# Altium footprint library TarabusLib_KOR.PcbLib: 560 footprints (part 14 of 35)
Each footprint in its own frame and in the unit in brackets; x right, y up, seen from the top. Pads: shape width x height; smd on the part's side, far side on the other; paste and mask are expansions set on the pad; w line width, h text height; cw(c..) or ccw(c..) is an arc to the next point about the centre after c.
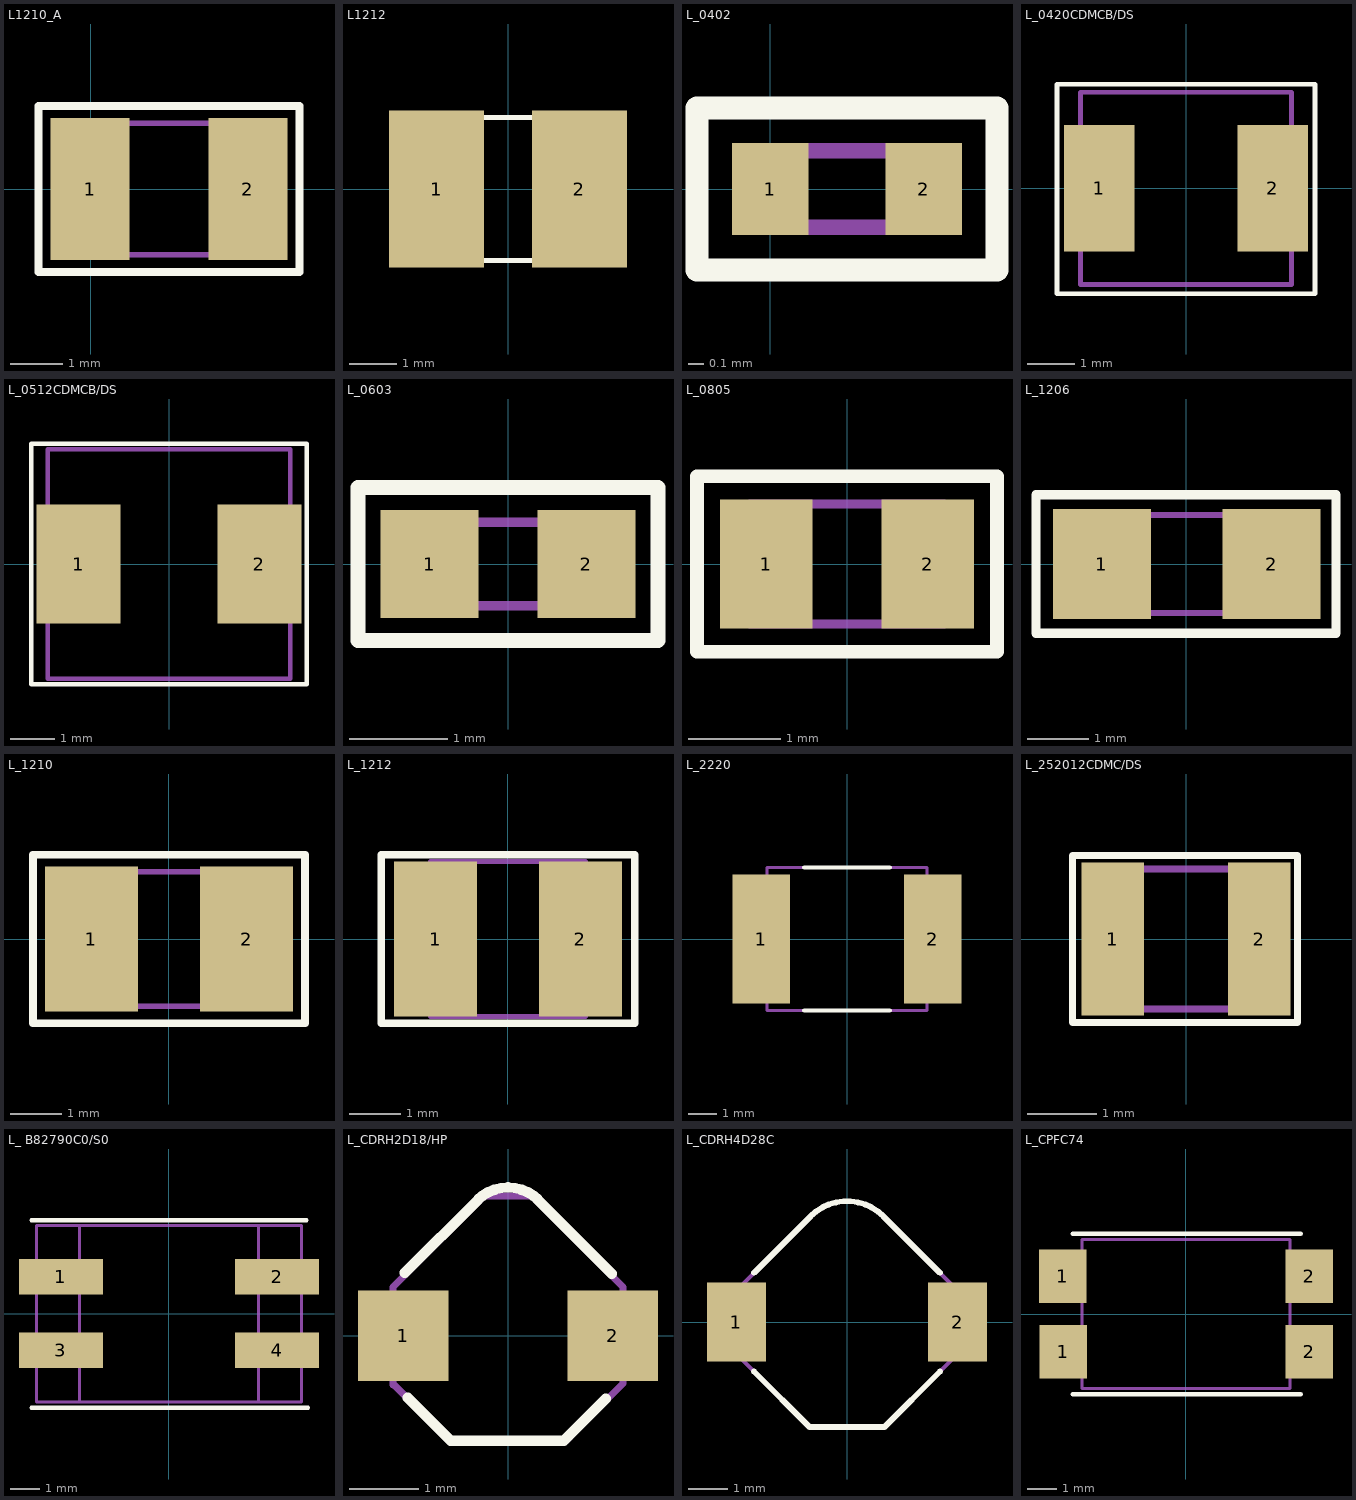
[diagram p13: the footprints below, top view; thin cyan lines are the x and y axes]

## L1210_A [mm]
pads (2):
  rect 1.5x2.7 smd: 1(-0.01,0) 2(2.99,0)
Top Overlay:
  lines w0.15: -0.99,-1.58 -0.99,1.58 3.97,1.58 3.97,-1.58 -0.99,-1.58
Mechanical 7:
  lines w0.1: -0.11,-1.25 3.09,-1.25 3.09,1.25 -0.11,1.25 -0.11,-1.25
Mechanical 10:
  text ".Designator" at 0.78,1.89 h0.8
  text ".Comment" at 0.75,-2.23 h0.6
3D body: height 2.5, standoff 0, extent -0.11,-1.25 3.09,1.25

## L1212 [mm]
pads (2):
  rect 2x3.3 smd: 1(-1.5,0) 2(1.5,0)
Top Overlay:
  lines w0.1: -1.5,-1.5 -1.5,1.5 1.5,1.5 1.5,-1.5 -1.5,-1.5
Mechanical 7:
  lines w0.1: -1.5,-1.5 -1.5,1.5 1.5,1.5 1.5,-1.5 -1.5,-1.5
Mechanical 10:
  text ".Comment" at -1,3.8 h1
  text ".Designator" at -1,2.9 h1

## L_0402 [mm]
pads (2):
  rect 0.5x0.6 smd: 1(0,0) 2(1,0)
Top Overlay:
  lines w0.15: -0.48,-0.53 1.48,-0.53 1.48,0.53 -0.48,0.53 -0.48,-0.53
Mechanical 7:
  lines w0.1: 0,-0.25 0,0.25 1,0.25 1,-0.25 0,-0.25
Mechanical 10:
  text ".Comment" at -0.08,-1.11 h0.6
  text ".Designator" at -0.08,0.75 h0.8
3D body: height 0.35, standoff 0, extent 0,-0.25 1,0.25

## L_0420CDMCB/DS [mm] "SMD Power Inductor SUMIDA"
height 1.2
pads (2):
  rect 1.5x2.7 smd mask+0: 1(-1.85,0) 2(1.85,0)
Top Overlay:
  lines w0.1: -2.75,-2.25 -2.75,2.225 2.75,2.225 2.75,-2.25 -2.75,-2.25
Mechanical 9:
  text ".Comment" at -1.15,-2.8 h0.6
  text ".Designator" at -1.8,2.5 h0.8
Mechanical 11:
  lines w0.1: -2.25,-2.05 2.25,-2.05 2.25,2.05 -2.25,2.05 -2.25,-2.05
3D body: height 1.2, standoff 0.05, extent -2.25,-2.05 2.25,2.05

## L_0512CDMCB/DS [mm] "SMD Power Inductor SUMIDA"
height 1.2
pads (2):
  rect 1.9x2.7 smd mask+0: 1(-2.05,0) 2(2.05,0)
Top Overlay:
  lines w0.1: -3.125,-2.725 3.125,-2.725 3.125,2.725 -3.125,2.725 -3.125,-2.725
Mechanical 7:
  lines w0.1: -2.75,-2.6 -2.75,2.6 2.75,2.6 2.75,-2.6 -2.75,-2.6
Mechanical 10:
  text ".Designator" at -1.775,3 h0.8
  text ".Comment" at -1.1,-3.275 h0.6
3D body: height 1.2, standoff 0.05, extent -2.75,-2.6 2.75,2.6

## L_0603 [mm]
height 0.45
pads (2):
  rect 1x1.1 smd: 1(-0.8,0) 2(0.8,0)
Top Overlay:
  lines w0.15: -1.53,-0.78 -1.53,0.78 1.53,0.78 1.53,-0.78 -1.53,-0.78
Mechanical 7:
  lines w0.1: -0.8,-0.425 0.8,-0.425 0.8,0.425 -0.8,0.425 -0.8,-0.425
Mechanical 10:
  text ".Designator" at -0.62,1 h0.8
  text ".Comment" at -0.78,-1.36 h0.6
3D body: height 0.45, standoff 0, extent -0.8,-0.425 0.8,0.425

## L_0805 [mm]
height 1.4
pads (2):
  rect 1x1.4 smd: 1(-0.875,0) 2(0.875,0)
Top Overlay:
  lines w0.15: -1.625,-0.95 1.625,-0.95 1.625,0.95 -1.625,0.95 -1.625,-0.95
Mechanical 7:
  lines w0.1: -1.05,-0.65 1.05,-0.65 1.05,0.65 -1.05,0.65 -1.05,-0.65
Mechanical 10:
  text ".Comment" at -1.125,-1.625 h0.6
  text ".Designator" at -1.525,1.375 h0.8
3D body: height 1.4, standoff 0, extent -1.05,-0.65 1.05,0.65

## L_1206 [mm]
height 1.5
pads (2):
  rect 1.6x1.8 smd: 1(-1.375,0) 2(1.4,0)
Top Overlay:
  lines w0.15: -2.45,-1.13 2.45,-1.13 2.45,1.13 -2.45,1.13 -2.45,-1.13
Mechanical 7:
  lines w0.1: -1.6,-0.8 -1.6,0.8 1.6,0.8 1.6,-0.8 -1.6,-0.8
Mechanical 10:
  text ".Comment" at -1.075,-1.65 h0.6
  text ".Designator" at -1.375,1.35 h0.8
3D body: height 1.5, standoff 0, extent -1.6,-0.8 1.6,0.8

## L_1210 [mm]
height 0.55
pads (2):
  rect 1.8x2.8 smd: 1(-1.5,0) 2(1.5,0)
Top Overlay:
  lines w0.15: -2.63,-1.63 2.63,-1.63 2.63,1.63 -2.63,1.63 -2.63,-1.63
Mechanical 7:
  lines w0.1: -1.6,-1.3 1.6,-1.3 1.6,1.3 -1.6,1.3 -1.6,-1.3
Mechanical 10:
  text ".Designator" at -0.71,1.89 h0.8
  text ".Comment" at -0.81,-2.25 h0.6
3D body: height 0.55, standoff 0, extent -1.55,-1.3 1.55,1.3

## L_1212 [mm]
height 0.9
pads (2):
  rect 1.6x3 smd: 1(-1.4,0) 2(1.4,0)
Top Overlay:
  lines w0.15: -2.45,-1.63 -2.45,1.63 2.45,1.63 2.45,-1.63 -2.45,-1.63
Mechanical 7:
  lines w0.1: -1.5,-1.5 -1.5,1.5 1.5,1.5 1.5,-1.5 -1.5,-1.5
Mechanical 10:
  text ".Comment" at -0.81,-2.25 h0.6
  text ".Designator" at -0.71,1.89 h0.8
3D body: height 0.9, standoff 0, extent -1.5,-1.5 1.5,1.5

## L_2220 [mm]
height 1.8
pads (2):
  rect 2x4.5 smd: 1(-3,0) 2(3,0)
Top Overlay:
  lines w0.15: -1.5,-2.5 1.5,-2.5 ; -1.5,2.5 1.5,2.5
Mechanical 7:
  lines w0.1: -2.8,-2.5 -2.8,2.5 2.8,2.5 2.8,-2.5 -2.8,-2.5
Mechanical 10:
  text ".Designator" at -0.56,3.04 h0.8
  text ".Comment" at -0.5,-3.49 h0.6
3D body: height 5, standoff 0, extent -2.8,-2.5 2.8,2.5

## L_252012CDMC/DS [mm] "SMD Power Inductor SUMIDA"
height 1.2
pads (2):
  rect 0.9x2.2 smd mask+0: 1(-1.05,0) 2(1.05,0)
Top Overlay:
  lines w0.1: -1.625,-1.2 1.6,-1.2 1.6,1.2 -1.625,1.2 -1.625,-1.2
Mechanical 7:
  lines w0.1: -1.25,-1 1.25,-1 1.25,1 -1.25,1 -1.25,-1
Mechanical 10:
  text ".Designator" at -1.7,1.475 h0.8
  text ".Comment" at -1.725,-1.8 h0.6
3D body: height 1.2, standoff 0.05, extent -1.25,-1 1.25,1

## L_ B82790C0/S0 [mm]
height 5
pads (4):
  rect 2.85x1.2 smd: 1(-3.675,1.25) 2(3.675,1.25) 3(-3.675,-1.25) 4(3.675,-1.25)
Top Overlay:
  lines w0.15: -4.675,-3.2 4.725,-3.2 ; -4.675,3.175 4.675,3.175
Mechanical 7:
  lines w0.1: -3.05,-3 -3.05,3 ; 3.05,-3 3.05,3 ; -4.5,-3 -4.5,3 4.5,3 4.5,-3 -4.5,-3
Mechanical 10:
  text ".Designator" at -1.7,3.625 h0.8
  text ".Comment" at -1.25,-3.9 h0.6
3D body: height 5, standoff 0, extent -3.035,-3 3.075,3

## L_CDRH2D18/HP [mm]
height 2
pads (2):
  rect 1.3x1.3 smd: 1(-1.5,0) 2(1.5,0)
Top Overlay:
  lines w0.15: -1.478,0.903 -0.436,1.945 cw(c0,1.508) 0.436,1.945 ; -1.438,-0.888 -0.823,-1.502 0.798,-1.502 1.4,-0.9 ; 0.425,1.95 1.488,0.888
Mechanical 7:
  lines w0.1: -1.65,-0.707 -1.65,0.7 -0.35,2 0.35,2 1.65,0.7 1.65,-0.685 0.955,-1.381 0.835,-1.5 -0.7,-1.5 -0.835,-1.5 -1.638,-0.697
Mechanical 10:
  text ".Comment" at -1.225,-3.6 h0.6
  text ".Designator" at -1.9,3.425 h0.8
3D body: height 2, standoff 0.05, extent -1.65,-1.5 1.65,2

## L_CDRH4D28C [mm]
height 3
pads (2):
  rect 1.5x2 smd: 1(-2.8,0) 2(2.8,0)
Top Overlay:
  lines w0.15: -2.356,-1.25 -0.955,-2.652 0.955,-2.652 2.356,-1.25 ; -2.353,1.253 -0.919,2.687 cw(c0,1.768) 0.919,2.687 2.353,1.253
Mechanical 7:
  lines w0.1: -2.899,-0.707 -0.955,-2.652 0.955,-2.652 2.899,-0.707 2.899,0.707 0.919,2.687 ccw(c0,1.768) -0.919,2.687 -2.899,0.707 -2.899,-0.707
Mechanical 10:
  text ".Comment" at -1.225,-3.6 h0.6
  text ".Designator" at -1.9,3.425 h0.8
3D body: height 3, standoff 0, extent -1.29,0.47 1.3,3.065
3D body: height 3, standoff 0, extent -2.899,-2.652 2.899,2.687

## L_CPFC74 [mm]
height 5
pads (4):
  rect 1.6x1.8 smd: 1(-4.14,1.27) 1(-4.13,-1.27) 2(4.14,-1.27) 2(4.14,1.27)
Top Overlay:
  lines w0.15: -3.8,-2.7 3.85,-2.7 ; -3.8,2.7 3.85,2.7
Mechanical 7:
  lines w0.1: -3.5,-2.5 -3.5,2.5 3.5,2.5 3.5,-2.5 -3.5,-2.5
Mechanical 10:
  text ".Designator" at -3.35,3.16 h0.8
  text ".Comment" at -3.38,-0.96 h0.6
3D body: height 5, standoff 0, extent -3.5,-2.5 3.5,2.5